# Altium footprint library Molex FFC - FPC Connectors (Through-Hole).PcbLib: 219 footprints (part 7 of 14)
Each footprint in its own frame and in the unit in brackets; x right, y up, seen from the top. Pads: shape width x height; smd on the part's side, far side on the other; paste and mask are expansions set on the pad; w line width, h text height; cw(c..) or ccw(c..) is an arc to the next point about the centre after c.
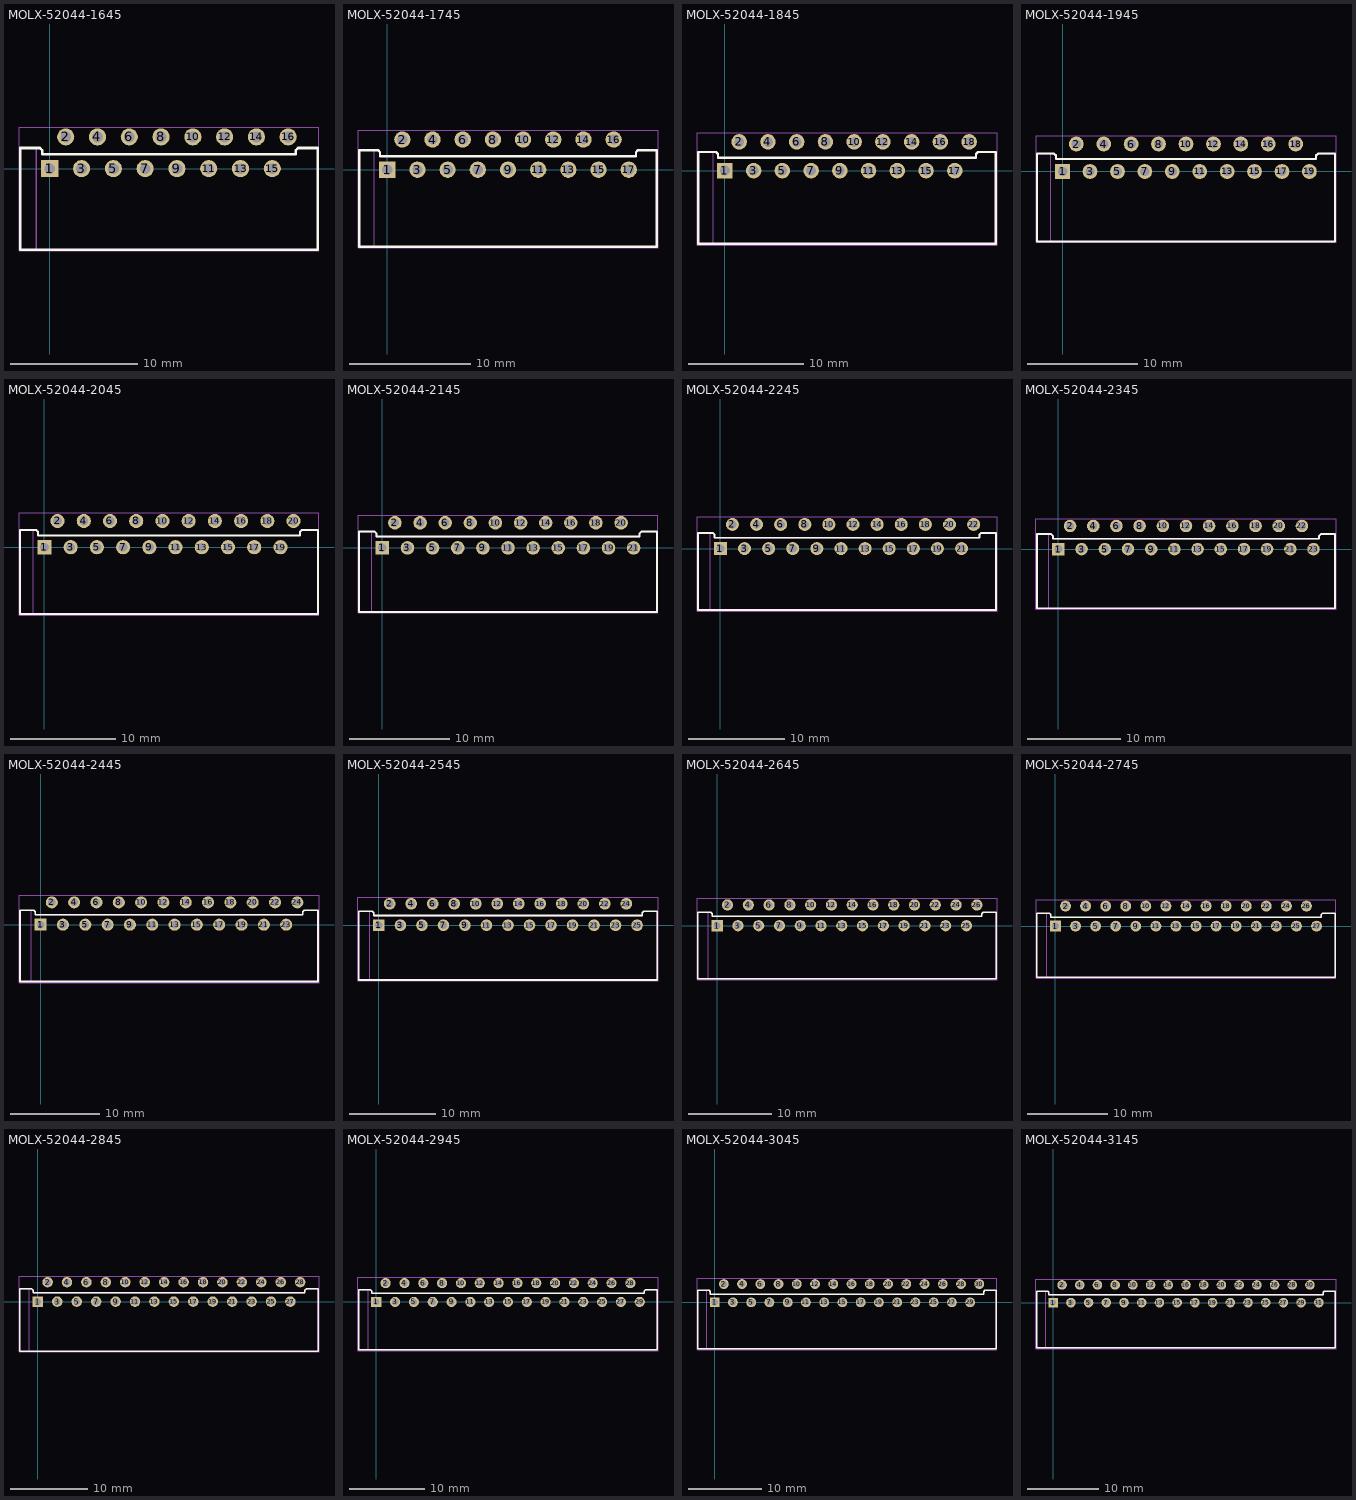
[diagram p6: the footprints below, top view; thin cyan lines are the x and y axes]

## MOLX-52044-1645 [mm] "FFC Connector, 16-Leads, Right Angle, Pitch 1.25 mm, Mated Height 5.1 mm, Through Hole"
height 5.012
pads (16):
  rect 1.35x1.35 hole 0.85: 1(0,0)
  round 1.35 hole 0.85: 2(1.25,2.5) 3(2.5,0) 4(3.75,2.5) 5(5,0) 6(6.25,2.5) 7(7.5,0) 8(8.75,2.5) 9(10,0) 10(11.25,2.5) 11(12.5,0) 12(13.75,2.5) 13(15,0) 14(16.25,2.5) 15(17.5,0) 16(18.75,2.5)
Top Overlay:
  lines w0.2: -2.325,-6.375 -2.325,1.625 -0.775,1.625 -0.6,1.45 -0.6,1.125 19.35,1.125 19.35,1.45 19.525,1.625 21.075,1.625 21.075,-6.375 -2.325,-6.375
Mechanical 13:
  lines w0.1: -1.075,-6.375 -1.075,1.625 ; -0.775,1.625 -0.6,1.45 -0.6,1.125 19.35,1.125 19.35,1.45 19.525,1.625 ; -0.775,1.625 -1.075,1.625 ; 19.525,1.625 21.075,1.625 21.075,-6.375 -2.325,-6.375 -2.325,1.625 -1.075,1.625
Mechanical 15:
  lines w0.05: 21.175,-6.475 -2.425,-6.475 -2.425,3.275 21.175,3.275 21.175,-6.47
3D body "520441645.stp": height 5.01, standoff -3.49, extent -2.325,-6.375 21.075,2.625

## MOLX-52044-1745 [mm] "FFC Connector, 17-Leads, Right Angle, Pitch 1.25 mm, Mated Height 5.1 mm, Through Hole"
height 5.012
pads (17):
  rect 1.35x1.35 hole 0.85: 1(0,0)
  round 1.35 hole 0.85: 2(1.25,2.5) 3(2.5,0) 4(3.75,2.5) 5(5,0) 6(6.25,2.5) 7(7.5,0) 8(8.75,2.5) 9(10,0) 10(11.25,2.5) 11(12.5,0) 12(13.75,2.5) 13(15,0) 14(16.25,2.5) 15(17.5,0) 16(18.75,2.5) 17(20,0)
Top Overlay:
  lines w0.2: -2.325,-6.375 -2.325,1.625 -0.775,1.625 -0.6,1.45 -0.6,1.125 20.6,1.125 20.6,1.45 20.775,1.625 22.325,1.625 22.325,-6.375 -2.325,-6.375
Mechanical 13:
  lines w0.1: -1.075,-6.375 -1.075,1.625 ; -2.325,-6.375 -2.325,1.625 -0.775,1.625 -0.6,1.45 -0.6,1.125 20.6,1.125 20.6,1.45 20.775,1.625 22.325,1.625 22.325,-6.375 -2.325,-6.375
Mechanical 15:
  lines w0.05: -2.425,-6.475 -2.425,3.275 22.425,3.275 22.425,-6.475 -2.425,-6.475
3D body "520441745.stp": height 5.01, standoff -3.49, extent -2.325,-6.375 22.325,2.625

## MOLX-52044-1845 [mm] "FFC Connector, 18-Leads, Right Angle, Pitch 1.25 mm, Mated Height 5.1 mm, Through Hole"
height 5.012
pads (18):
  rect 1.35x1.35 hole 0.85: 1(0,0)
  round 1.35 hole 0.85: 2(1.25,2.5) 3(2.5,0) 4(3.75,2.5) 5(5,0) 6(6.25,2.5) 7(7.5,0) 8(8.75,2.5) 9(10,0) 10(11.25,2.5) 11(12.5,0) 12(13.75,2.5) 13(15,0) 14(16.25,2.5) 15(17.5,0) 16(18.75,2.5) 17(20,0) 18(21.25,2.5)
Top Overlay:
  lines w0.2: -2.325,1.625 -0.775,1.625 -0.6,1.45 -0.6,1.125 21.85,1.125 21.85,1.45 22.025,1.625 23.575,1.625 23.575,-6.375 -2.325,-6.375 -2.325,1.625
Mechanical 13:
  lines w0.1: -1.069,-6.39 -1.075,1.625 ; 23.569,-6.375 -2.325,-6.375 -2.325,1.625 -1.075,1.625 ; 23.575,-6.369 23.575,1.625 22.025,1.625 21.85,1.45 21.85,1.125 -0.6,1.125 -0.6,1.45 -0.775,1.625 -1.075,1.625
Mechanical 15:
  lines w0.05: -2.425,-6.475 23.675,-6.475 23.675,3.275 -2.425,3.275 -2.425,-6.475
3D body "520441845.stp": height 5.01, standoff -3.49, extent -2.325,-6.375 23.575,2.625

## MOLX-52044-1945 [mm] "FFC Connector, 19-Leads, Right Angle, Pitch 1.25 mm, Mated Height 5.1 mm, Through Hole"
height 5.012
pads (19):
  rect 1.35x1.35 hole 0.85: 1(0,0)
  round 1.35 hole 0.85: 2(1.25,2.5) 3(2.5,0) 4(3.75,2.5) 5(5,0) 6(6.25,2.5) 7(7.5,0) 8(8.75,2.5) 9(10,0) 10(11.25,2.5) 11(12.5,0) 12(13.75,2.5) 13(15,0) 14(16.25,2.5) 15(17.5,0) 16(18.75,2.5) 17(20,0) 18(21.25,2.5) 19(22.5,0)
Top Overlay:
  lines w0.2: -0.775,1.625 -2.325,1.625 -2.325,-6.375 24.825,-6.375 24.825,1.625 23.275,1.625 23.1,1.45 23.1,1.125 -0.6,1.125 -0.6,1.45 -0.775,1.625 ; -0.775,1.625 -0.775,1.625 ; -0.775,1.625 -0.775,1.625
Mechanical 13:
  lines w0.1: -1.075,-6.375 -1.075,1.625 ; -2.325,-6.375 -2.325,1.625 -0.775,1.625 -0.6,1.45 -0.6,1.125 23.1,1.125 23.1,1.45 23.275,1.625 24.825,1.625 24.825,-6.375 -2.325,-6.375
Mechanical 15:
  lines w0.05: -2.425,-6.475 -2.425,3.275 24.925,3.275 24.925,-6.475 -2.425,-6.475
3D body "520441945.stp": height 5.01, standoff -3.49, extent -2.325,-6.375 24.825,2.625

## MOLX-52044-2045 [mm] "FFC Connector, 20-Leads, Right Angle, Pitch 1.25 mm, Mated Height 5.1 mm, Through Hole"
height 5.012
pads (20):
  rect 1.35x1.35 hole 0.85: 1(0,0)
  round 1.35 hole 0.85: 2(1.25,2.5) 3(2.5,0) 4(3.75,2.5) 5(5,0) 6(6.25,2.5) 7(7.5,0) 8(8.75,2.5) 9(10,0) 10(11.25,2.5) 11(12.5,0) 12(13.75,2.5) 13(15,0) 14(16.25,2.5) 15(17.5,0) 16(18.75,2.5) 17(20,0) 18(21.25,2.5) 19(22.5,0) 20(23.75,2.5)
Top Overlay:
  lines w0.2: -2.325,-6.375 -2.325,1.625 -0.775,1.625 -0.6,1.45 -0.6,1.125 24.35,1.125 24.35,1.45 24.525,1.625 26.075,1.625 26.075,-6.375 -2.325,-6.375
Mechanical 13:
  lines w0.1: -1.075,-6.375 -1.075,1.625 ; 24.525,1.625 24.35,1.45 24.35,1.125 -0.6,1.125 -0.6,1.45 -0.775,1.625 -2.325,1.625 -2.325,-6.375 26.075,-6.375 26.075,1.625 24.525,1.629
Mechanical 15:
  lines w0.05: -2.425,-6.475 -2.425,3.275 26.175,3.275 26.175,-6.475 -2.425,-6.475
3D body "520442045.stp": height 5.01, standoff -3.49, extent -2.325,-6.375 26.075,2.625

## MOLX-52044-2145 [mm] "FFC Connector, 21-Leads, Right Angle, Pitch 1.25 mm, Mated Height 5.1 mm, Through Hole"
height 5.012
pads (21):
  rect 1.35x1.35 hole 0.85: 1(0,0)
  round 1.35 hole 0.85: 2(1.25,2.5) 3(2.5,0) 4(3.75,2.5) 5(5,0) 6(6.25,2.5) 7(7.5,0) 8(8.75,2.5) 9(10,0) 10(11.25,2.5) 11(12.5,0) 12(13.75,2.5) 13(15,0) 14(16.25,2.5) 15(17.5,0) 16(18.75,2.5) 17(20,0) 18(21.25,2.5) 19(22.5,0) 20(23.75,2.5) 21(25,0)
Top Overlay:
  lines w0.2: -2.325,-6.375 -2.325,1.625 -0.775,1.625 -0.6,1.45 -0.6,1.125 25.6,1.125 25.6,1.45 25.775,1.625 27.325,1.625 27.325,-6.375 -2.325,-6.375
Mechanical 13:
  lines w0.1: -1.075,-6.375 -1.075,1.625 ; -1.075,1.625 -2.325,1.625 -2.325,-6.375 27.325,-6.375 27.325,1.625 25.775,1.625 25.6,1.45 25.6,1.125 -0.6,1.125 -0.6,1.45 -0.775,1.625 -1.075,1.625
Mechanical 15:
  lines w0.05: -2.425,-6.475 -2.425,3.275 27.425,3.275 27.425,-6.475 -2.425,-6.475
3D body "520442145.stp": height 5.01, standoff -3.49, extent -2.325,-6.375 27.325,2.625

## MOLX-52044-2245 [mm] "FFC Connector, 22-Leads, Right Angle, Pitch 1.25 mm, Mated Height 5.1 mm, Through Hole"
height 5.012
pads (22):
  rect 1.35x1.35 hole 0.85: 1(0,0)
  round 1.35 hole 0.85: 2(1.25,2.5) 3(2.5,0) 4(3.75,2.5) 5(5,0) 6(6.25,2.5) 7(7.5,0) 8(8.75,2.5) 9(10,0) 10(11.25,2.5) 11(12.5,0) 12(13.75,2.5) 13(15,0) 14(16.25,2.5) 15(17.5,0) 16(18.75,2.5) 17(20,0) 18(21.25,2.5) 19(22.5,0) 20(23.75,2.5) 21(25,0) 22(26.25,2.5)
Top Overlay:
  lines w0.2: -2.325,1.625 -0.775,1.625 -0.6,1.45 -0.6,1.125 26.85,1.125 26.85,1.45 27.025,1.625 28.575,1.625 28.575,-6.375 -2.325,-6.375 -2.325,1.625
Mechanical 13:
  lines w0.1: -1.075,-6.375 -1.075,1.625 ; 27.025,1.625 26.85,1.45 26.85,1.125 -0.6,1.125 -0.6,1.45 -0.775,1.625 -2.325,1.625 -2.325,-6.375 28.575,-6.375 28.575,1.625 27.025,1.625
Mechanical 15:
  lines w0.05: -2.425,-6.475 -2.425,3.275 28.675,3.275 28.675,-6.475 -2.425,-6.475
3D body "520442245.stp": height 5.01, standoff -3.49, extent -2.325,-6.375 28.575,2.625

## MOLX-52044-2345 [mm] "FFC Connector, 23-Leads, Right Angle, Pitch 1.25 mm, Mated Height 5.1 mm, Through Hole"
height 5.012
pads (23):
  rect 1.35x1.35 hole 0.85: 1(0,0)
  round 1.35 hole 0.85: 2(1.25,2.5) 3(2.5,0) 4(3.75,2.5) 5(5,0) 6(6.25,2.5) 7(7.5,0) 8(8.75,2.5) 9(10,0) 10(11.25,2.5) 11(12.5,0) 12(13.75,2.5) 13(15,0) 14(16.25,2.5) 15(17.5,0) 16(18.75,2.5) 17(20,0) 18(21.25,2.5) 19(22.5,0) 20(23.75,2.5) 21(25,0) 22(26.25,2.5) 23(27.5,0)
Top Overlay:
  lines w0.2: -2.325,-6.375 -2.325,1.625 -0.775,1.625 -0.6,1.45 -0.6,1.125 28.1,1.125 28.1,1.45 28.275,1.625 29.825,1.625 29.825,-6.375 -2.325,-6.375
Mechanical 13:
  lines w0.1: -1.075,-6.375 -1.075,1.625 ; -2.325,-6.375 -2.325,1.625 -0.775,1.625 -0.6,1.45 -0.6,1.125 28.1,1.125 28.1,1.45 28.275,1.625 29.825,1.625 29.825,-6.375 -2.325,-6.375
Mechanical 15:
  lines w0.05: 29.925,-6.475 -2.425,-6.475 -2.425,3.275 29.925,3.275 29.925,-6.475 ; 29.925,-6.475 29.925,-6.475
3D body "520442345.stp": height 5.01, standoff -3.49, extent -2.325,-6.375 29.825,2.625

## MOLX-52044-2445 [mm] "FFC Connector, 24-Leads, Right Angle, Pitch 1.25 mm, Mated Height 5.1 mm, Through Hole"
height 5.012
pads (24):
  rect 1.35x1.35 hole 0.85: 1(0,0)
  round 1.35 hole 0.85: 2(1.25,2.5) 3(2.5,0) 4(3.75,2.5) 5(5,0) 6(6.25,2.5) 7(7.5,0) 8(8.75,2.5) 9(10,0) 10(11.25,2.5) 11(12.5,0) 12(13.75,2.5) 13(15,0) 14(16.25,2.5) 15(17.5,0) 16(18.75,2.5) 17(20,0) 18(21.25,2.5) 19(22.5,0) 20(23.75,2.5) 21(25,0) 22(26.25,2.5) 23(27.5,0) 24(28.75,2.5)
Top Overlay:
  lines w0.2: 31.075,1.625 29.525,1.625 ; 31.075,1.625 31.075,-6.375 -2.325,-6.375 -2.325,1.625 -0.775,1.625 ; -0.775,1.625 -0.775,1.625 ; -0.775,1.625 -0.6,1.45 -0.6,1.125 29.35,1.125 29.35,1.45 29.525,1.625 ; 29.525,1.625 29.525,1.625
Mechanical 13:
  lines w0.1: -1.075,-6.375 -1.075,1.625 ; -2.325,-6.375 31.075,-6.375 31.075,1.625 29.525,1.625 29.35,1.45 29.35,1.125 -0.6,1.125 -0.6,1.45 -0.775,1.625 -2.325,1.625 -2.325,-6.375
Mechanical 15:
  lines w0.05: -2.425,-6.475 31.175,-6.475 31.175,3.275 -2.425,3.275 -2.425,-6.475
3D body "520442445.stp": height 5.01, standoff -3.49, extent -2.325,-6.375 31.075,2.625

## MOLX-52044-2545 [mm] "FFC Connector, 25-Leads, Right Angle, Pitch 1.25 mm, Mated Height 5.1 mm, Through Hole"
height 5.012
pads (25):
  rect 1.35x1.35 hole 0.85: 1(0,0)
  round 1.35 hole 0.85: 2(1.25,2.5) 3(2.5,0) 4(3.75,2.5) 5(5,0) 6(6.25,2.5) 7(7.5,0) 8(8.75,2.5) 9(10,0) 10(11.25,2.5) 11(12.5,0) 12(13.75,2.5) 13(15,0) 14(16.25,2.5) 15(17.5,0) 16(18.75,2.5) 17(20,0) 18(21.25,2.5) 19(22.5,0) 20(23.75,2.5) 21(25,0) 22(26.25,2.5) 23(27.5,0) 24(28.75,2.5) 25(30,0)
Top Overlay:
  lines w0.2: -0.775,1.625 -0.6,1.45 -0.6,1.125 30.6,1.125 30.6,1.45 30.775,1.625 ; -0.775,1.625 -0.775,1.625 ; -0.775,1.625 -2.325,1.625 -2.325,-6.375 32.325,-6.375 32.325,1.625 30.775,1.625 ; 30.775,1.625 30.775,1.625
Mechanical 13:
  lines w0.1: -1.075,-6.375 -1.075,1.625 ; 30.6,1.125 -0.6,1.125 -0.6,1.45 -0.775,1.625 -2.325,1.625 -2.325,-6.375 ; 30.6,1.125 30.6,1.45 30.775,1.625 32.325,1.625 32.325,-6.375 -2.325,-6.375 ; -2.325,-6.375 -2.325,-6.375 ; -2.325,-6.375 -2.325,-6.375
Mechanical 15:
  lines w0.05: -2.425,-6.475 32.425,-6.475 32.425,3.275 -2.425,3.275 -2.425,-6.475
3D body "520442545.stp": height 5.01, standoff -3.49, extent -2.325,-6.375 32.325,2.625

## MOLX-52044-2645 [mm] "FFC Connector, 26-Leads, Right Angle, Pitch 1.25 mm, Mated Height 5.1 mm, Through Hole"
height 5.012
pads (26):
  rect 1.35x1.35 hole 0.85: 1(0,0)
  round 1.35 hole 0.85: 2(1.25,2.5) 3(2.5,0) 4(3.75,2.5) 5(5,0) 6(6.25,2.5) 7(7.5,0) 8(8.75,2.5) 9(10,0) 10(11.25,2.5) 11(12.5,0) 12(13.75,2.5) 13(15,0) 14(16.25,2.5) 15(17.5,0) 16(18.75,2.5) 17(20,0) 18(21.25,2.5) 19(22.5,0) 20(23.75,2.5) 21(25,0) 22(26.25,2.5) 23(27.5,0) 24(28.75,2.5) 25(30,0) 26(31.25,2.5)
Top Overlay:
  lines w0.2: -0.775,1.625 -0.6,1.45 -0.6,1.125 31.85,1.125 31.85,1.45 32.025,1.625 32.025,1.625 33.575,1.625 33.575,-6.375 -2.325,-6.375 -2.325,1.625 -0.775,1.625 ; -0.775,1.625 -0.775,1.625
Mechanical 13:
  lines w0.1: -1.075,-6.375 -1.075,1.625 ; -2.325,-6.375 -2.325,1.625 -0.775,1.625 -0.6,1.45 -0.6,1.125 31.85,1.125 31.85,1.45 32.025,1.625 33.575,1.625 33.575,-6.375 -2.325,-6.375
Mechanical 15:
  lines w0.05: -2.425,-6.475 -2.425,3.275 33.675,3.275 33.675,-6.475 -2.425,-6.475
3D body "520442645.stp": height 5.01, standoff -3.49, extent -2.325,-6.375 33.575,2.625

## MOLX-52044-2745 [mm] "FFC Connector, 27-Leads, Right Angle, Pitch 1.25 mm, Mated Height 5.1 mm, Through Hole"
height 5.012
pads (27):
  rect 1.35x1.35 hole 0.85: 1(0,0)
  round 1.35 hole 0.85: 2(1.25,2.5) 3(2.5,0) 4(3.75,2.5) 5(5,0) 6(6.25,2.5) 7(7.5,0) 8(8.75,2.5) 9(10,0) 10(11.25,2.5) 11(12.5,0) 12(13.75,2.5) 13(15,0) 14(16.25,2.5) 15(17.5,0) 16(18.75,2.5) 17(20,0) 18(21.25,2.5) 19(22.5,0) 20(23.75,2.5) 21(25,0) 22(26.25,2.5) 23(27.5,0) 24(28.75,2.5) 25(30,0) 26(31.25,2.5) 27(32.5,0)
Top Overlay:
  lines w0.2: -2.325,1.625 -2.325,-6.375 34.825,-6.375 34.825,1.625 ; -2.325,1.625 -0.775,1.625 ; 34.825,1.625 33.275,1.625 ; -0.775,1.625 -0.6,1.45 -0.6,1.125 33.1,1.125 33.1,1.45 33.275,1.625 ; -0.775,1.625 -0.775,1.625 ; 33.275,1.625 33.275,1.625
Mechanical 13:
  lines w0.1: -1.075,-6.375 -1.075,1.625 ; -0.775,1.625 -2.325,1.625 -2.325,-6.375 34.825,-6.375 34.825,1.625 ; -0.775,1.625 -0.6,1.45 -0.6,1.125 33.1,1.125 33.1,1.45 33.275,1.625 34.825,1.625
Mechanical 15:
  lines w0.05: -2.425,-6.475 34.925,-6.475 ; -2.425,-6.475 -2.425,3.275 34.925,3.275 34.925,-6.475
3D body "520442745.stp": height 5.01, standoff -3.49, extent -2.325,-6.375 34.825,2.625

## MOLX-52044-2845 [mm] "FFC Connector, 28-Leads, Right Angle, Pitch 1.25 mm, Mated Height 5.1 mm, Through Hole"
height 5.012
pads (28):
  rect 1.35x1.35 hole 0.85: 1(0,0)
  round 1.35 hole 0.85: 2(1.25,2.5) 3(2.5,0) 4(3.75,2.5) 5(5,0) 6(6.25,2.5) 7(7.5,0) 8(8.75,2.5) 9(10,0) 10(11.25,2.5) 11(12.5,0) 12(13.75,2.5) 13(15,0) 14(16.25,2.5) 15(17.5,0) 16(18.75,2.5) 17(20,0) 18(21.25,2.5) 19(22.5,0) 20(23.75,2.5) 21(25,0) 22(26.25,2.5) 23(27.5,0) 24(28.75,2.5) 25(30,0) 26(31.25,2.5) 27(32.5,0) 28(33.75,2.5)
Top Overlay:
  lines w0.2: -2.325,1.625 -2.325,-6.375 36.075,-6.375 36.075,1.625 ; -2.325,1.625 -0.775,1.625 ; 36.075,1.625 34.525,1.625 ; -0.775,1.625 -0.775,1.625 ; -0.775,1.625 -0.6,1.45 -0.6,1.125 34.35,1.125 34.35,1.45 34.525,1.625 ; 34.525,1.625 34.525,1.625
Mechanical 13:
  lines w0.1: -1.075,-6.375 -1.075,1.625 ; 36.075,1.625 36.075,-6.375 -2.325,-6.375 -2.325,1.625 -0.775,1.625 -0.6,1.45 -0.6,1.125 34.35,1.125 34.35,1.45 34.525,1.625 36.075,1.625
Mechanical 15:
  lines w0.05: -2.425,-6.475 36.174,-6.475 36.174,3.275 -2.425,3.275 -2.425,-6.475
3D body "520442845.stp": height 5.01, standoff -3.49, extent -2.325,-6.375 36.075,2.625

## MOLX-52044-2945 [mm] "FFC Connector, 29-Leads, Right Angle, Pitch 1.25 mm, Mated Height 5.1 mm, Through Hole"
height 5.012
pads (29):
  rect 1.35x1.35 hole 0.85: 1(0,0)
  round 1.35 hole 0.85: 2(1.25,2.5) 3(2.5,0) 4(3.75,2.5) 5(5,0) 6(6.25,2.5) 7(7.5,0) 8(8.75,2.5) 9(10,0) 10(11.25,2.5) 11(12.5,0) 12(13.75,2.5) 13(15,0) 14(16.25,2.5) 15(17.5,0) 16(18.75,2.5) 17(20,0) 18(21.25,2.5) 19(22.5,0) 20(23.75,2.5) 21(25,0) 22(26.25,2.5) 23(27.5,0) 24(28.75,2.5) 25(30,0) 26(31.25,2.5) 27(32.5,0) 28(33.75,2.5) 29(35,0)
Top Overlay:
  lines w0.2: -2.325,-6.375 37.325,-6.375 37.325,1.625 35.775,1.625 ; -2.325,-6.375 -2.325,1.625 -0.775,1.625 ; 35.6,1.125 35.6,1.45 35.775,1.625 ; 35.6,1.125 -0.6,1.125 -0.6,1.45 -0.775,1.625 ; -0.775,1.625 -0.775,1.625 ; 35.775,1.625 35.775,1.625
Mechanical 13:
  lines w0.1: -1.075,-6.375 -1.075,1.625 ; -2.325,-6.375 -2.325,-6.375 37.325,-6.375 37.325,1.625 35.775,1.625 35.6,1.45 35.6,1.125 -0.6,1.125 -0.6,1.45 -0.775,1.625 -2.325,1.625 -2.325,-6.375 ; -2.325,-6.375 -2.325,-6.375
Mechanical 15:
  lines w0.05: -2.425,-6.475 37.425,-6.475 37.425,3.275 -2.425,3.275 -2.425,-6.475
3D body "520442945.stp": height 5.01, standoff -3.49, extent -2.325,-6.375 37.325,2.625

## MOLX-52044-3045 [mm] "FFC Connector, 30-Leads, Right Angle, Pitch 1.25 mm, Mated Height 5.1 mm, Through Hole"
height 5.012
pads (30):
  rect 1.35x1.35 hole 0.85: 1(0,0)
  round 1.35 hole 0.85: 2(1.25,2.5) 3(2.5,0) 4(3.75,2.5) 5(5,0) 6(6.25,2.5) 7(7.5,0) 8(8.75,2.5) 9(10,0) 10(11.25,2.5) 11(12.5,0) 12(13.75,2.5) 13(15,0) 14(16.25,2.5) 15(17.5,0) 16(18.75,2.5) 17(20,0) 18(21.25,2.5) 19(22.5,0) 20(23.75,2.5) 21(25,0) 22(26.25,2.5) 23(27.5,0) 24(28.75,2.5) 25(30,0) 26(31.25,2.5) 27(32.5,0) 28(33.75,2.5) 29(35,0) 30(36.25,2.5)
Top Overlay:
  lines w0.2: -0.775,1.625 -0.6,1.45 -0.6,1.125 36.85,1.125 36.85,1.45 37.025,1.625 38.575,1.625 38.575,-6.375 -2.325,-6.375 -2.325,1.625 -0.775,1.625 ; -0.775,1.625 -0.775,1.625
Mechanical 13:
  lines w0.1: -1.075,-6.375 -1.075,1.625 ; -2.325,-6.375 -2.325,1.625 -0.775,1.625 -0.6,1.45 -0.6,1.125 36.85,1.125 36.85,1.45 37.025,1.625 38.575,1.625 38.575,-6.375 -2.325,-6.375
Mechanical 15:
  lines w0.05: -2.425,-6.475 -2.425,3.275 38.675,3.275 38.675,-6.475 -2.425,-6.475
3D body "520443045.stp": height 5.01, standoff -3.49, extent -2.325,-6.375 38.575,2.625

## MOLX-52044-3145 [mm] "FFC Connector, 31-Leads, Right Angle, Pitch 1.25 mm, Mated Height 5.1 mm, Through Hole"
height 5.012
pads (31):
  rect 1.35x1.35 hole 0.85: 1(0,0)
  round 1.35 hole 0.85: 2(1.25,2.5) 3(2.5,0) 4(3.75,2.5) 5(5,0) 6(6.25,2.5) 7(7.5,0) 8(8.75,2.5) 9(10,0) 10(11.25,2.5) 11(12.5,0) 12(13.75,2.5) 13(15,0) 14(16.25,2.5) 15(17.5,0) 16(18.75,2.5) 17(20,0) 18(21.25,2.5) 19(22.5,0) 20(23.75,2.5) 21(25,0) 22(26.25,2.5) 23(27.5,0) 24(28.75,2.5) 25(30,0) 26(31.25,2.5) 27(32.5,0) 28(33.75,2.5) 29(35,0) 30(36.25,2.5) 31(37.5,0)
Top Overlay:
  lines w0.2: -0.775,1.625 -2.325,1.625 -2.325,-6.375 39.825,-6.375 39.825,1.625 38.275,1.625 38.1,1.45 38.1,1.125 -0.6,1.125 -0.6,1.45 -0.775,1.625 ; -0.775,1.625 -0.775,1.625
Mechanical 13:
  lines w0.1: -1.075,-6.375 -1.075,1.625 ; -2.325,-6.375 39.825,-6.375 39.825,1.625 38.275,1.625 38.1,1.45 38.1,1.125 -0.6,1.125 -0.6,1.45 -0.775,1.625 -2.325,1.625 -2.325,-6.375
Mechanical 15:
  lines w0.05: -2.425,-6.475 39.925,-6.475 39.925,3.275 -2.425,3.275 -2.425,-6.475
3D body "520443145.stp": height 5.01, standoff -3.49, extent -2.325,-6.375 39.825,2.625